# Altium footprint library SPECIAL.PcbLib: 68 footprints (part 1 of 5)
Each footprint in its own frame and in the unit in brackets; x right, y up, seen from the top. Pads: shape width x height; smd on the part's side, far side on the other; paste and mask are expansions set on the pad; w line width, h text height; cw(c..) or ccw(c..) is an arc to the next point about the centre after c.
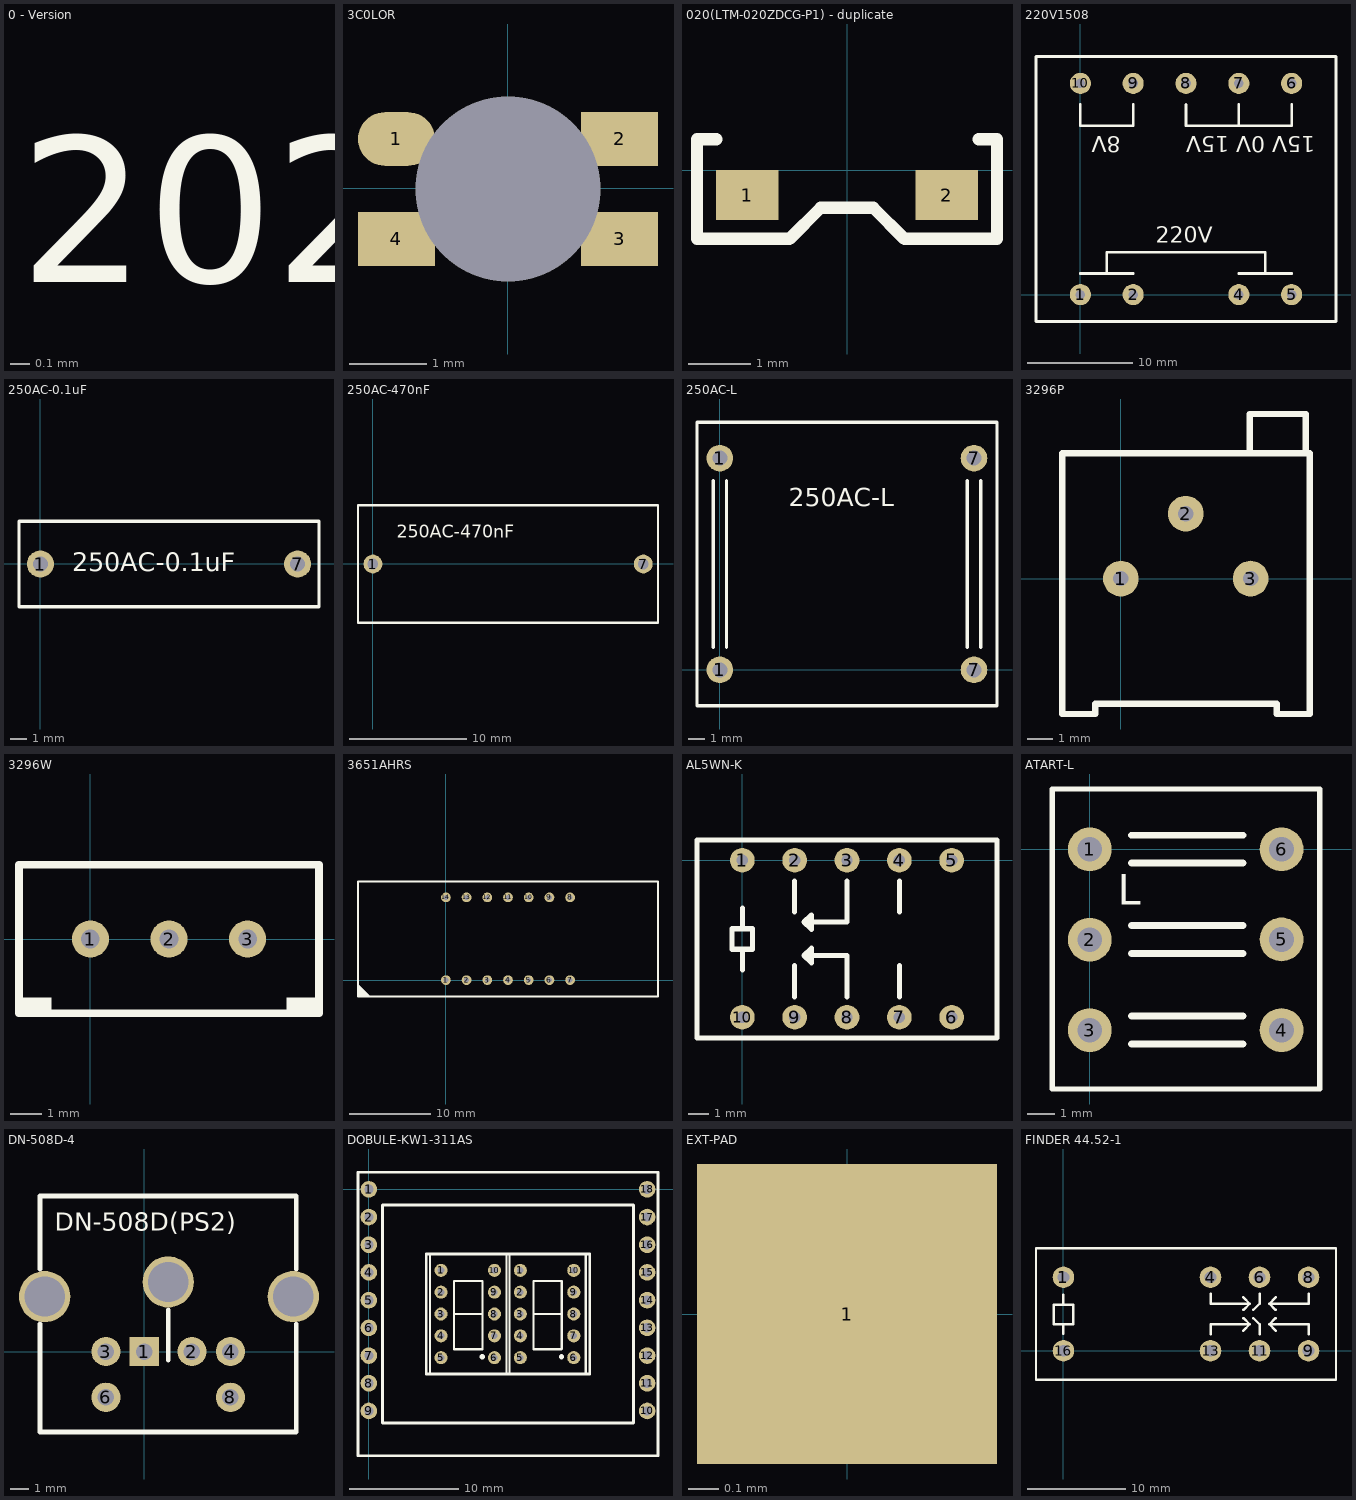
[diagram p0: the footprints below, top view; thin cyan lines are the x and y axes]

## 0 - Version [mm]
Top Overlay:
  text "SPECIAL / v1.0.2 / 2020/02/03" at -1269.375,-1269.45 h1.52

## 3C0LOR [mm]
pads (5):
  oval 1x0.7 smd: 1(-1.449,0.642)
  rect 1x0.7 smd: 2(1.451,0.642) 3(1.451,-0.658) 4(-1.449,-0.658)
  round 2 hole 2.4 unplated: ""(0.001,-0.008)

## 020(LTM-020ZDCG-P1) - duplicate [mm]
height 0.45
pads (2):
  rect 1x0.8 smd: 1(-1.6,-0.4) 2(1.6,-0.4)
Top Overlay:
  lines w0.2: -2.095,0.5 -2.4,0.5 -2.4,-1.1 -0.92,-1.1 -0.42,-0.6 0.42,-0.6 0.92,-1.1 2.4,-1.1 2.4,0.5 2.106,0.5
3D body "User Library-MicroSIDELED_3806.STEP": height 0.6, standoff 0, extent -1.9,-0.425 1.9,0.575

## 220V1508 [mm]
pads (9):
  round 2 hole 0.9: 1(0,0) 2(5,0) 4(15,0) 5(20,0) 6(20,20) 7(15,20) 8(10,20) 9(5,20) 10(0,20)
Top Overlay:
  lines w0.254: 0,2 5,2 ; 0,18 0,16 5,16 5,18 ; 2.5,2 2.5,4 17.5,4 17.5,2 ; 10,18 10,16 20,16 20,18 ; 15,2 20,2 ; 15,16 15,18 ; -4.2,-2.55 -4.2,22.55 24.2,22.55 24.2,-2.55 -4.2,-2.55
  text "15V 0V 15V" at 22.25,15 h1.52
  text "8V" at 3.825,15 h1.52
  text "220V" at 7.125,4.9 h1.52

## 250AC-0.1uF [mm]
pads (2):
  round 1.6 hole 0.9: 1(0,0) 7(15.24,0)
Top Overlay:
  lines w0.2: -1.27,-2.54 -1.27,2.54 ; -1.25,-2.54 16.51,-2.54 16.51,2.54 -1.25,2.54
  text "250AC-0.1uF" at 1.875,-0.425 h1.1

## 250AC-470nF [mm]
pads (2):
  round 1.6 hole 0.9: 1(-0.005,-0.005) 7(22.995,-0.005)
Top Overlay:
  lines w0.2: -1.275,-5.005 -1.275,4.994 ; -1.256,-5.005 24.244,-5.005 24.244,4.994 -1.256,4.994
  text "250AC-470nF" at 2.019,2.245 h1.1

## 250AC-L [mm]
pads (4):
  round 1.6 hole 0.9: 1(0,0) 1(0,12.7) 7(15.25,0) 7(15.25,12.7)
Top Overlay:
  lines w0.2: -0.4,1.35 -0.4,11.35 ; 0.4,1.35 0.4,11.35 ; 14.85,1.35 14.85,11.35 ; 15.65,1.35 15.65,11.35 ; -1.37,-2.15 16.63,-2.15 16.63,14.85 -1.37,14.85 -1.37,-2.15
  text "250AC-L" at 4.13,9.8 h1.1

## 3296P [mm]
height 5
pads (3):
  round 1.4 hole 0.6: 1(0,0) 2(2.54,2.54) 3(5.08,0)
Top Overlay:
  lines w0.254: -2.3,-5.3 -2.3,4.9 7.4,4.9 7.4,-5.3 6.11,-5.3 ; -2.29,-5.3 -1,-5.3 -1,-4.9 ; -0.99,-4.9 6.1,-4.9 6.1,-5.3 ; 5.04,4.9 5.04,6.44 ; 5.05,6.44 7.24,6.44 7.24,4.9
3D body "3296P.STEP": height 4.9, standoff -2, extent -2.225,-5.23 7.305,6.32

## 3296W [mm]
height 10
pads (3):
  round 1.2 hole 0.6: 1(0,0) 2(2.54,0) 3(5.08,0)
Top Overlay:
  region: 7.38,-1.89 6.34,-1.89 6.34,-2.31 7.38,-2.31
  rectangle: -2.3,-2.31 -1.26,-1.89
  lines w0.25: -2.31,-2.4 7.39,-2.4 7.39,2.4 -2.31,2.4 -2.31,-2.4
3D body "User Library-Trimming Potentiometer Vertical 3296W 203 - 20k.STEP": height 11.63, standoff -6.4, extent -2.235,-2.4 7.295,2.43

## 3651AHRS [mm]
pads (14):
  round 1.2 hole 0.6: 1(-0.012,0.003) 2(2.528,0.003) 3(5.068,0.003) 4(7.608,0.003) 5(10.148,0.003) 6(12.688,0.003) 7(15.228,0.003) 8(15.228,10.163) 9(12.688,10.163) 10(10.148,10.163) 11(7.608,10.163) 12(5.068,10.163) 13(2.528,10.163) 14(-0.012,10.163)
Top Overlay:
  lines w0.254: -10.792,-1.667 -10.472,-1.987 ; -10.762,-1.447 -10.232,-1.977 ; -10.762,-1.147 -9.972,-1.937 ; -10.752,-0.647 -9.422,-1.977 ; -10.632,-0.977 -9.612,-1.997 ; -10.792,-1.997 -10.792,12.103 26.008,12.103 26.008,-1.997 -10.792,-1.997
3D body "User Library-3561BS.STEP": height 7, standoff -6.3, extent -10.61,-1.87 25.89,12.13

## AL5WN-K [mm]
pads (10):
  round 1.2 hole 0.55: 1(0,0) 2(2.54,0) 3(5.08,0) 4(7.62,0) 5(10.16,0) 6(10.16,-7.62) 7(7.62,-7.62) 8(5.08,-7.62) 9(2.54,-7.62) 10(0,-7.62)
Top Overlay:
  lines w0.25: 0,-5.32 0,-4.32 ; 0,-3.32 0,-2.32 ; 2.54,-6.62 2.54,-5.12 ; 2.54,-2.5 2.54,-1 ; 5.08,-6.62 5.08,-4.62 3,-4.62 ; 5.08,-1 5.08,-3 3,-3 ; 7.62,-6.62 7.62,-5.12 ; 7.62,-2.5 7.62,-1 ; 3,-4.62 3.35,-4.97 3.35,-4.27 3,-4.62 ; 3,-3 3.35,-2.65 3.35,-3.35 3,-3 ; -2.2,-8.62 -2.2,0.98 12.36,0.98 12.36,-8.62 -2.2,-8.62 ; -0.5,-4.32 -0.5,-3.32 0.5,-3.32 0.5,-4.32 -0.5,-4.32
3D body "User Library-a-24w-k.STEP": height 5.5, standoff -2.87, extent -1.989,-8.292 12.011,0.708

## ATART-L [mm]
pads (6):
  round 1.6 hole 0.9: 1(0,0) 2(0,-3.3) 3(0,-6.6) 4(7,-6.6) 5(7,-3.292) 6(7,0)
Top Overlay:
  lines w0.2: -1.375,-8.75 8.4,-8.75 8.4,2.2 -1.375,2.2 -1.375,-8.75
  lines w0.254: 1.524,-7.108 5.588,-7.108 ; 1.524,-6.092 5.588,-6.092 ; 1.524,-3.806 5.588,-3.806 ; 1.524,-2.79 5.588,-2.79 ; 1.524,-0.504 5.588,-0.504 ; 1.524,0.512 5.588,0.512
  text "L" at 1.016,-2.028 h1.1

## DN-508D-4 [mm]
pads (9):
  rect 1.6x1.6 hole 0.9: 1(0,0)
  round 1.6 hole 0.9: 2(2.6,0) 3(-2.1,0) 4(4.7,0) 6(-2.1,-2.5) 8(4.7,-2.5)
  round 2.8 hole 2.2: ""(-5.45,3) ""(1.3,3.8) ""(8.14,3)
Top Overlay:
  lines w0.254: -5.7,1.5 -5.7,-4.4 8.3,-4.4 8.3,1.5 ; -5.7,4.5 -5.7,8.5 8.3,8.5 8.3,4.5 ; 1.3,-0.475 1.3,2.275
  text "DN-508D(PS2)" at -4.9,6.6 h1

## DOBULE-KW1-311AS [mm]
pads (38):
  round 1.524 hole 0.85: 1(-0.004,0) 2(-0.004,-2.54) 3(-0.004,-5.08) 4(-0.004,-7.62) 5(-0.004,-10.16) 6(-0.004,-12.7) 7(-0.004,-15.24) 8(-0.004,-17.78) 9(-0.004,-20.32) 10(25.496,-20.32) 11(25.496,-17.78) 12(25.496,-15.24) 13(25.496,-12.7) 14(25.496,-10.16) 15(25.496,-7.62) 16(25.496,-5.08) 17(25.496,-2.54) 18(25.496,0)
  round 1.2 hole 0.6: 1(6.606,-7.43) 1(13.877,-7.43) 2(6.606,-9.43) 2(13.877,-9.43) 3(6.606,-11.43) 3(13.877,-11.43) 4(6.606,-13.43) 4(13.877,-13.43) 5(6.606,-15.43) 5(13.877,-15.43) 6(11.506,-15.43) 6(18.777,-15.43) 7(11.506,-13.43) 7(18.777,-13.43) 8(11.506,-11.43) 8(18.777,-11.43) 9(11.506,-9.43) 9(18.777,-9.43) 10(11.506,-7.43) 10(18.777,-7.43)
Top Overlay:
  lines w0.2: 7.806,-11.43 10.406,-11.43 ; 10.381,-14.655 7.806,-14.655 7.806,-8.405 10.406,-8.405 10.406,-14.63 ; 15.077,-11.43 17.677,-11.43 ; 17.652,-14.655 15.077,-14.655 15.077,-8.405 17.677,-8.405 17.677,-14.63 ; 5.606,-16.93 12.606,-16.93 12.606,-5.93 5.606,-5.93 5.606,-16.93 ; 12.877,-16.93 19.877,-16.93 19.877,-5.93 12.877,-5.93 12.877,-16.93
  lines w0.254: -1.004,1.57 -1.004,-24.43 26.458,-24.43 ; -1.003,1.569 26.459,1.569 ; 5.247,-16.932 20.246,-16.932 ; 24.246,-24.43 26.496,-24.43 26.496,1.57 24.268,1.57 ; 5.246,-16.93 20.246,-16.93 20.246,-5.93 5.246,-5.93 5.246,-16.93 ; 5.246,-16.93 5.247,-16.93 ; 1.246,-21.43 1.246,-1.43 24.246,-1.43 24.246,-21.43 1.246,-21.43
  lines w0.5: 10.381,-15.355 10.381,-15.33 ; 17.652,-15.355 17.652,-15.33
3D body: height 5.01, standoff 5, extent 18.779,-15.93 19.377,-15.331
3D body: height 5.01, standoff 5, extent 14.528,-11.976 18.228,-10.976
3D body: height 5.01, standoff 5, extent 17.729,-11.276 18.729,-7.576
3D body: height 5.01, standoff 5, extent 17.728,-15.376 18.728,-11.676
3D body: height 5.01, standoff 5, extent 14.528,-15.875 18.228,-14.875
3D body: height 5.01, standoff 5, extent 14.028,-15.376 15.028,-11.676
3D body: height 5.01, standoff 5, extent 14.029,-11.275 15.029,-7.575
3D body: height 5.01, standoff 5, extent 14.529,-8.077 18.229,-7.077
3D body: height 0, standoff -2, extent 13.654,-7.654 14.102,-7.205
3D body: height 0, standoff -2, extent 13.654,-9.654 14.102,-9.205
3D body: height 0, standoff -2, extent 13.654,-11.654 14.102,-11.205
3D body: height 0, standoff -2, extent 13.654,-13.654 14.102,-13.205
3D body: height 0, standoff -2, extent 13.654,-15.654 14.102,-15.205
3D body: height 0, standoff -2, extent 18.554,-15.654 19.002,-15.205
3D body: height 0, standoff -2, extent 18.554,-13.654 19.002,-13.205
3D body: height 0, standoff -2, extent 18.554,-11.654 19.002,-11.205
3D body: height 0, standoff -2, extent 18.554,-9.654 19.002,-9.205
3D body: height 0, standoff -2, extent 18.554,-7.654 19.002,-7.205
3D body: height 5, standoff 4.99, extent 12.877,-16.94 19.877,-5.94
3D body: height 4.99, standoff 0.5, extent 12.877,-16.93 19.877,-5.93
3D body: height 0.5, standoff 0.49, extent 13.377,-16.43 19.377,-6.43
3D body: height 0.5, standoff 0, extent 12.877,-16.93 13.877,-15.93
3D body: height 0.5, standoff 0, extent 18.877,-16.93 19.877,-15.93
3D body: height 0.5, standoff 0, extent 18.877,-6.93 19.877,-5.93
3D body: height 0.5, standoff 0, extent 12.877,-6.93 13.877,-5.93
3D body: height 5.01, standoff 5, extent 11.508,-15.93 12.106,-15.331
3D body: height 5.01, standoff 5, extent 7.257,-11.976 10.957,-10.976
3D body: height 5.01, standoff 5, extent 10.458,-11.276 11.458,-7.576
3D body: height 5.01, standoff 5, extent 10.457,-15.376 11.457,-11.676
3D body: height 5.01, standoff 5, extent 7.257,-15.875 10.957,-14.875
3D body: height 5.01, standoff 5, extent 6.757,-15.376 7.757,-11.676
3D body: height 5.01, standoff 5, extent 6.758,-11.275 7.758,-7.575
3D body: height 5.01, standoff 5, extent 7.258,-8.077 10.958,-7.077
3D body: height 0, standoff -2, extent 6.383,-7.654 6.831,-7.205
3D body: height 0, standoff -2, extent 6.383,-9.654 6.831,-9.205
3D body: height 0, standoff -2, extent 6.383,-11.654 6.831,-11.205
3D body: height 0, standoff -2, extent 6.383,-13.654 6.831,-13.205
3D body: height 0, standoff -2, extent 6.383,-15.654 6.831,-15.205
3D body: height 0, standoff -2, extent 11.283,-15.654 11.731,-15.205
3D body: height 0, standoff -2, extent 11.283,-13.654 11.731,-13.205
3D body: height 0, standoff -2, extent 11.283,-11.654 11.731,-11.205
3D body: height 0, standoff -2, extent 11.283,-9.654 11.731,-9.205
3D body: height 0, standoff -2, extent 11.283,-7.654 11.731,-7.205
3D body: height 5, standoff 4.99, extent 5.606,-16.93 12.606,-5.93
3D body: height 4.99, standoff 0.5, extent 5.606,-16.93 12.606,-5.93
3D body: height 0.5, standoff 0.49, extent 6.106,-16.43 12.106,-6.43
3D body: height 0.5, standoff 0, extent 5.606,-16.93 6.606,-15.93
3D body: height 0.5, standoff 0, extent 11.606,-16.93 12.606,-15.93
3D body: height 0.5, standoff 0, extent 11.606,-6.93 12.606,-5.93
3D body: height 0.5, standoff 0, extent 5.606,-6.93 6.606,-5.93

## EXT-PAD [mm]
pads (1):
  rect 1x1 smd: 1(0,0)

## FINDER 44.52-1 [mm]
pads (8):
  round 2.2 hole 1.2: 1(0,7.5) 4(15,7.5) 6(20,7.5) 8(25,7.5) 9(25,0) 11(20,0) 13(15,0) 16(0,0)
Top Overlay:
  lines w0.25: 0,1.71 0,2.71 ; 0,4.71 0,5.71 ; 15,2.7 19,2.7 ; 15,4.8 19,4.8 ; 21,2.7 25,2.7 ; 21,4.8 25,4.8 ; -1,2.71 -1,4.71 1,4.71 1,2.71 -1,2.71
  lines w0.254: 15,1.7 15,2.7 ; 15,4.8 15,5.8 ; 18.36,2.06 19,2.7 18.36,3.34 ; 18.36,4.16 19,4.8 18.36,5.44 ; 19.36,3.34 20,2.7 20,1.7 ; 19.36,4.16 20,4.8 20,5.8 ; 21.64,2.06 21,2.7 21.64,3.34 ; 21.64,4.16 21,4.8 21.64,5.44 ; 25,1.7 25,2.7 ; 25,4.8 25,5.8 ; -2.8,-2.95 -2.8,10.45 27.8,10.45 27.8,-2.95 -2.8,-2.95